# Altium footprint library AI.PcbLib: 137 footprints (part 1 of 9)
Each footprint in its own frame and in the unit in brackets; x right, y up, seen from the top. Pads: shape width x height; smd on the part's side, far side on the other; paste and mask are expansions set on the pad; w line width, h text height; cw(c..) or ccw(c..) is an arc to the next point about the centre after c.
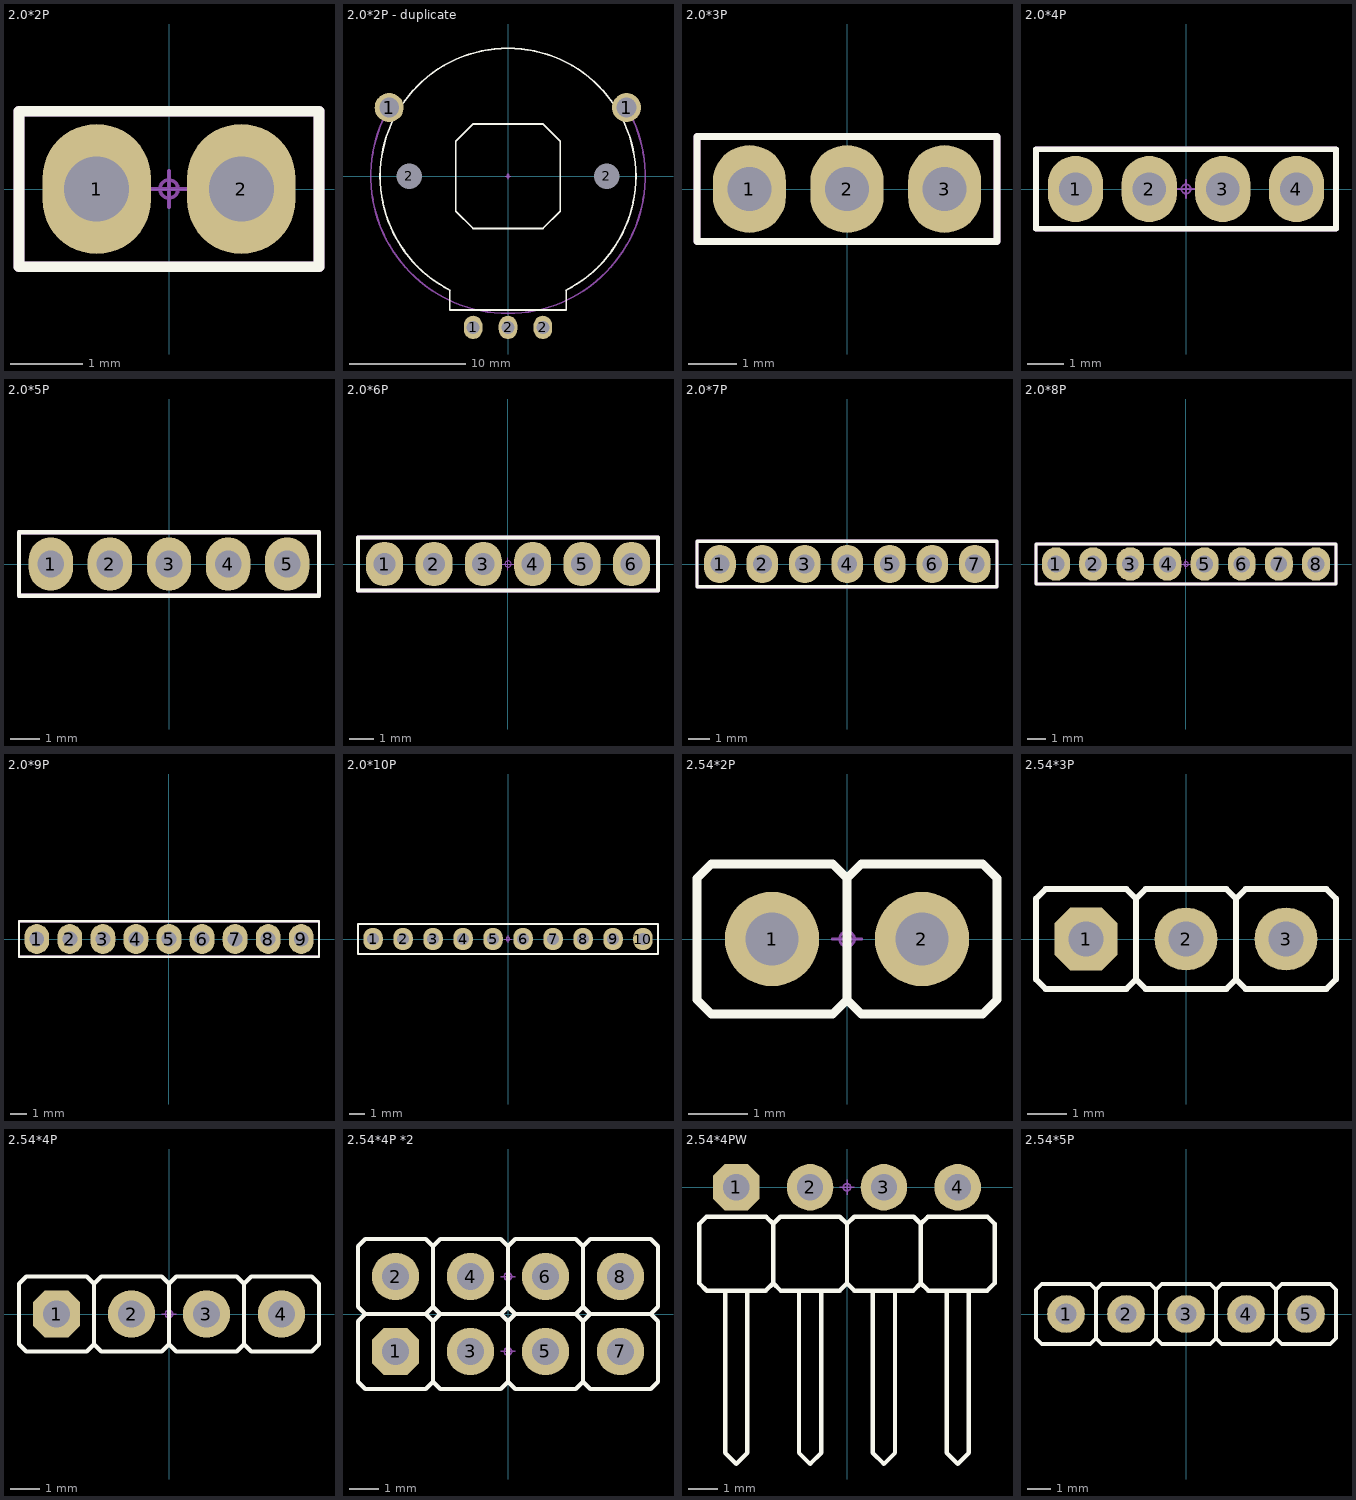
[diagram p0: the footprints below, top view; thin cyan lines are the x and y axes]

## 2.0*2P [mm]
height 8.4
pads (2):
  oval 1.5x1.8 hole 0.9: 1(-1,0) 2(1,0)
Top Overlay:
  lines w0.15: -2.075,-1.075 2.075,-1.075 2.075,1.075 -2.075,1.075 -2.075,-1.075
Mechanical 15:
  circle w0.05: c0,0 r0.125
  lines w0.05: -0.25,0 0.25,0 ; 0,-0.25 0,0.25
  lines w0.15: -2.075,-1.075 2.075,-1.075 2.075,1.075 -2.075,1.075 -2.075,-1.075
3D body "1x2x02.stp": height 5.6, standoff -2.8, extent -2,-1 2,1

## 2.0*2P - duplicate [mm]
height 8.4
pads (7):
  round 2.5 hole 1.7: 1(-10.219,5.9) 1(10.2,5.9)
  oval 1.6x2 hole 1.1: 1(-3,-13) 2(0,-13) 2(3,-13)
  round 1.5 hole 2.2: 2(-8.5,0) 2(8.5,0)
Top Overlay:
  lines w0.152: -5,-9.8 -5,-11.5 5,-11.5 5,-9.798 ; -4.999,-9.798 cw(c0,0) 4.999,-9.798 ; -4.5,-3 -3,-4.5 3,-4.5 4.5,-3 4.5,3 3,4.5 -3,4.5 -4.5,3 -4.5,-3
Mechanical 11:
  lines w0.152: -10.219,5.9 ccw(c0,0) 0,-11.8 ccw(c0,0) 10.219,5.9
Mechanical 15:
  circle w0.05: c0,0 r0.125
  lines w0.05: -0.25,0 0.25,0 ; 0,-0.25 0,0.25

## 2.0*3P [mm]
height 8.4
pads (3):
  oval 1.5x1.8 hole 0.9: 1(-2,0) 2(0,0) 3(2,0)
Top Overlay:
  lines w0.15: -3.075,-1.075 -3.075,1.075 3.075,1.075 3.075,-1.075 -3.075,-1.075
Mechanical 15:
  circle w0.05: c0,0 r0.125
  lines w0.05: -0.25,0 0.25,0 ; 0,-0.25 0,0.25
  lines w0.15: -3.075,-1.075 -3.075,1.075 3.075,1.075 3.075,-1.075 -3.075,-1.075
3D body "1x2x03.stp": height 5.6, standoff -2.8, extent -3,-1 3,1

## 2.0*4P [mm]
height 8.4
pads (4):
  oval 1.5x1.8 hole 0.9: 1(-3,0) 2(-1,0) 3(1,0) 4(3,0)
Top Overlay:
  lines w0.15: -4.075,-1.075 -4.075,1.075 4.075,1.075 4.075,-1.075 -4.075,-1.075
Mechanical 15:
  circle w0.05: c0,0 r0.125
  lines w0.05: -0.25,0 0.25,0 ; 0,-0.25 0,0.25
  lines w0.15: -4.075,-1.075 -4.075,1.075 4.075,1.075 4.075,-1.075 -4.075,-1.075
3D body "1x2x04.stp": height 5.6, standoff -2.8, extent -4,-1 4,1

## 2.0*5P [mm]
height 8.4
pads (5):
  oval 1.5x1.8 hole 0.9: 1(-4,0) 2(-2,0) 3(0,0) 4(2,0) 5(4,0)
Top Overlay:
  lines w0.15: -5.075,-1.075 -5.075,1.075 5.075,1.075 5.075,-1.075 -5.075,-1.075
Mechanical 15:
  circle w0.05: c0,0 r0.125
  lines w0.05: -0.25,0 0.25,0 ; 0,-0.25 0,0.25
  lines w0.15: -5.075,-1.075 -5.075,1.075 5.075,1.075 5.075,-1.075 -5.075,-1.075
3D body "1x2x05.stp": height 5.6, standoff -2.8, extent -5,-1 5,1

## 2.0*6P [mm]
height 8.4
pads (6):
  oval 1.5x1.8 hole 0.9: 1(-5,0) 2(-3,0) 3(-1,0) 4(1,0) 5(3,0) 6(5,0)
Top Overlay:
  lines w0.15: -6.075,-1.075 -6.075,1.075 6.075,1.075 6.075,-1.075 -6.075,-1.075
Mechanical 15:
  circle w0.05: c0,0 r0.125
  lines w0.05: -0.25,0 0.25,0 ; 0,-0.25 0,0.25
  lines w0.15: -6.075,-1.075 -6.075,1.075 6.075,1.075 6.075,-1.075 -6.075,-1.075
3D body "1x2x06.stp": height 5.6, standoff -2.8, extent -6,-1 6,1

## 2.0*7P [mm]
height 8.4
pads (7):
  oval 1.5x1.8 hole 0.9: 1(-6,0) 2(-4,0) 3(-2,0) 4(0,0) 5(2,0) 6(4,0) 7(6,0)
Top Overlay:
  lines w0.15: -7.075,-1.075 -7.075,1.075 7.05,1.075 7.05,-1.075 -7.075,-1.075
Mechanical 15:
  circle w0.05: c0,0 r0.125
  lines w0.05: -0.25,0 0.25,0 ; 0,-0.25 0,0.25
  lines w0.15: -7.075,-1.075 -7.075,1.075 7.05,1.075 7.05,-1.075 -7.075,-1.075
3D body "1x2x07.stp": height 5.6, standoff -2.8, extent -7.025,-1 6.975,1

## 2.0*8P [mm]
height 8.4
pads (8):
  oval 1.5x1.8 hole 0.9: 1(-7,0) 2(-5,0) 3(-3,0) 4(-1,0) 5(1,0) 6(3,0) 7(5,0) 8(7,0)
Top Overlay:
  lines w0.15: -8.075,-1.075 -8.075,1.075 8.075,1.075 8.075,-1.075 -8.075,-1.075
Mechanical 15:
  circle w0.05: c0,0 r0.125
  lines w0.05: -0.25,0 0.25,0 ; 0,-0.25 0,0.25
  lines w0.15: -8.075,-1.075 -8.075,1.075 8.075,1.075 8.075,-1.075 -8.075,-1.075
3D body "1x2x08.stp": height 5.6, standoff -2.8, extent -8,-1 8,1

## 2.0*9P [mm]
height 8.4
pads (9):
  oval 1.5x1.8 hole 0.9: 1(-8,0) 2(-6,0) 3(-4,0) 4(-2,0) 5(0,0) 6(2,0) 7(4,0) 8(6,0) 9(8,0)
Top Overlay:
  lines w0.15: -9.075,-1.075 -9.075,1.075 9.075,1.075 9.075,-1.075 -9.075,-1.075
Mechanical 15:
  circle w0.05: c0,0 r0.125
  lines w0.05: -0.25,0 0.25,0 ; 0,-0.25 0,0.25
  lines w0.15: -9.075,-1.075 -9.075,1.075 9.075,1.075 9.075,-1.075 -9.075,-1.075
3D body "1x2x09.stp": height 5.6, standoff -2.8, extent -9.025,-1 8.975,1

## 2.0*10P [mm]
height 8.4
pads (10):
  oval 1.3x1.5 hole 0.8: 1(-9,0) 2(-7,0) 3(-5,0) 4(-3,0) 5(-1,0) 6(1,0) 7(3,0) 8(5,0) 9(7,0) 10(9,0)
Top Overlay:
  lines w0.15: -10,-1 10,-1 10,1 -10,1 -10,-1
Mechanical 15:
  circle w0.05: c0,0 r0.125
  lines w0.05: -0.25,0 0.25,0 ; 0,-0.25 0,0.25

## 2.54*2P [mm]
pads (2):
  round 1.6 hole 0.9: 1(-1.27,0) 2(1.27,0)
Top Overlay:
  lines w0.152: 0,-1.025 0.245,-1.27 2.295,-1.27 2.54,-1.025 2.54,1.025 2.295,1.27 0.245,1.27 0,1.025 ; 0,-1.025 0,1.025 ; 0,-1.025 -0.245,-1.27 -2.295,-1.27 -2.54,-1.025 -2.54,1.025 -2.295,1.27 -0.245,1.27 0,1.025
Mechanical 15:
  circle w0.05: c0,0 r0.125
  lines w0.05: -0.25,0 0.25,0 ; 0,-0.25 0,0.25
3D body "COMATEL_386.0358.1.02.440.stp": height 8, standoff -3.2, extent -2.54,-1.225 2.54,1.225

## 2.54*3P [mm]
pads (3):
  oct 1.6x1.6 hole 0.9: 1(-2.54,0)
  round 1.6 hole 0.9: 2(0,0) 3(2.54,0)
Top Overlay:
  lines w0.152: -1.27,-1.025 -1.025,-1.27 1.025,-1.27 1.27,-1.025 ; -1.27,-1.025 -1.27,1.025 ; -1.27,-1.025 -1.515,-1.27 -3.565,-1.27 -3.81,-1.025 -3.81,1.025 -3.565,1.27 -1.515,1.27 -1.27,1.025 ; -1.27,1.025 -1.025,1.27 1.025,1.27 1.27,1.025 ; 1.27,-1.025 1.515,-1.27 3.565,-1.27 3.81,-1.025 3.81,1.025 3.565,1.27 1.515,1.27 1.27,1.025 ; 1.27,-1.025 1.27,1.025
Mechanical 15:
  circle w0.05: c0,0 r0.125
  lines w0.05: -0.25,0 0.25,0 ; 0,-0.25 0,0.25
3D body "COMATEL_386.0358.1.03.440.stp": height 8, standoff -3.2, extent -3.81,-1.225 3.81,1.225

## 2.54*4P [mm]
pads (4):
  oct 1.6x1.6 hole 0.9: 1(-3.81,0)
  round 1.6 hole 0.9: 2(-1.27,0) 3(1.27,0) 4(3.81,0)
Top Overlay:
  lines w0.152: -2.54,-1.025 -2.295,-1.27 -0.245,-1.27 0,-1.025 ; -2.54,-1.025 -2.54,1.025 ; -2.54,-1.025 -2.785,-1.27 -4.835,-1.27 -5.08,-1.025 -5.08,1.025 -4.835,1.27 -2.785,1.27 -2.54,1.025 ; -2.54,1.025 -2.295,1.27 -0.245,1.27 0,1.025 ; 0,-1.025 0.245,-1.27 2.295,-1.27 2.54,-1.025 ; 0,-1.025 0,1.025 ; 0,1.025 0.245,1.27 2.295,1.27 2.54,1.025 ; 2.54,-1.025 2.785,-1.27 4.835,-1.27 5.08,-1.025 5.08,1.025 4.835,1.27 2.785,1.27 2.54,1.025 ; 2.54,-1.025 2.54,1.025
Mechanical 15:
  circle w0.05: c0,0 r0.125
  lines w0.05: -0.25,0 0.25,0 ; 0,-0.25 0,0.25
3D body "COMATEL_385.0358.1.04.400.stp": height 8, standoff -3.2, extent -5.08,-1.225 5.08,1.225

## 2.54*4P *2 [mm]
pads (8):
  oct 1.6x1.6 hole 0.9: 1(-3.81,-1.27)
  round 1.6 hole 0.9: 2(-3.81,1.27) 3(-1.27,-1.27) 4(-1.27,1.27) 5(1.27,-1.27) 6(1.27,1.27) 7(3.81,-1.27) 8(3.81,1.27)
Top Overlay:
  lines w0.152: -4.835,0 -5.08,-0.245 -5.08,-2.295 -4.835,-2.54 -2.785,-2.54 -2.54,-2.295 ; -4.835,0 -5.08,0.245 -5.08,2.295 -4.835,2.54 -2.785,2.54 -2.54,2.295 ; -4.835,0 -2.785,0 ; -2.785,0 -2.54,-0.245 ; -2.785,0 -2.54,0.245 ; -2.54,-2.295 -2.54,-0.245 ; -2.54,-2.295 -2.295,-2.54 -0.245,-2.54 0,-2.295 ; -2.54,-0.245 -2.295,0 ; -2.54,0.245 -2.295,0 ; -2.54,0.245 -2.54,2.295 ; -2.54,2.295 -2.295,2.54 -0.245,2.54 0,2.295 ; -2.295,0 -0.245,0 ; -0.245,0 0,-0.245 ; -0.245,0 0,0.245 ; 0,-2.295 0,-0.245 ; 0,-2.295 0.245,-2.54 2.295,-2.54 2.54,-2.295 ; 0,-0.245 0.245,0 ; 0,0.245 0.245,0 ; 0,0.245 0,2.295 ; 0,2.295 0.245,2.54 2.295,2.54 2.54,2.295 ; 0.245,0 2.295,0 ; 2.295,0 2.54,-0.245 ; 2.295,0 2.54,0.245 ; 2.54,-2.295 2.54,-0.245 ; 2.54,-2.295 2.785,-2.54 4.835,-2.54 5.08,-2.295 5.08,-0.245 4.835,0 ; 2.54,-0.245 2.785,0 ; 2.54,0.245 2.785,0 ; 2.54,0.245 2.54,2.295 ; 2.54,2.295 2.785,2.54 4.835,2.54 5.08,2.295 5.08,0.245 4.835,0 ; 2.785,0 4.835,0
Mechanical 15:
  circle w0.05: c0,-1.27 r0.125
  circle w0.05: c0,1.27 r0.125
  lines w0.05: -0.25,-1.27 0.25,-1.27 ; -0.25,1.27 0.25,1.27 ; 0,-1.52 0,-1.02 ; 0,1.02 0,1.52
3D body "COMATEL_385.0358.1.04.400.stp": height 8, standoff -3.2, extent -5.08,-2.495 5.08,-0.045
3D body "COMATEL_385.0358.1.04.400.stp": height 8, standoff -3.2, extent -5.08,0.045 5.08,2.495

## 2.54*4PW [mm]
pads (4):
  oct 1.6x1.6 hole 0.9: 1(-3.81,0)
  round 1.6 hole 0.9: 2(-1.27,0) 3(1.27,0) 4(3.81,0)
Top Overlay:
  lines w0.152: -4.831,-3.561 -5.08,-3.311 -5.08,-1.261 -4.835,-1.016 -2.785,-1.016 -2.54,-1.261 -2.295,-1.016 -0.245,-1.016 0,-1.261 0.245,-1.016 2.295,-1.016 2.54,-1.261 2.785,-1.016 4.835,-1.016 5.08,-1.261 ; -4.826,-3.556 -2.794,-3.556 -2.54,-3.302 ; -4.191,-3.556 -4.191,-9.144 -3.81,-9.525 -3.429,-9.144 -3.429,-3.556 ; -2.54,-1.252 -2.54,-3.302 ; -1.651,-3.556 -1.651,-9.144 -1.27,-9.525 -0.889,-9.144 -0.889,-3.556 ; 0,-1.252 0,-3.302 ; 0.889,-3.556 0.889,-9.144 1.27,-9.525 1.651,-9.144 1.651,-3.556 ; 2.54,-1.252 2.54,-3.302 ; 3.429,-3.556 3.429,-9.144 3.81,-9.525 4.191,-9.144 4.191,-3.556 ; 5.08,-1.252 5.08,-3.302 4.826,-3.556 2.794,-3.556 2.54,-3.302 ; -2.54,-3.302 -2.286,-3.556 -0.254,-3.556 0,-3.302 ; 0,-3.302 0.254,-3.556 2.286,-3.556 2.54,-3.302
Mechanical 15:
  circle w0.05: c0,0 r0.125
  lines w0.05: -0.25,0 0.25,0 ; 0,-0.25 0,0.25
3D body "hdr4.stp": height 2.54, standoff -1, extent -5.08,-10.001 5.08,0.349

## 2.54*5P [mm]
pads (5):
  round 1.6 hole 0.9: 1(-5.08,0) 2(-2.54,0) 3(0,0) 4(2.54,0) 5(5.08,0)
Top Overlay:
  lines w0.152: -3.81,-1.025 -4.055,-1.27 -6.105,-1.27 -6.35,-1.025 -6.35,1.025 -6.105,1.27 -4.055,1.27 -3.81,1.025 ; -3.81,-1.025 -3.81,1.025 ; -3.81,-1.025 -3.565,-1.27 -1.515,-1.27 -1.27,-1.025 ; -3.81,1.025 -3.565,1.27 -1.515,1.27 -1.27,1.025 ; -1.27,-1.025 -1.27,1.025 ; -1.27,-1.025 -1.025,-1.27 1.025,-1.27 1.27,-1.025 ; -1.27,1.025 -1.025,1.27 1.025,1.27 1.27,1.025 ; 1.27,-1.025 1.27,1.025 ; 1.27,-1.025 1.515,-1.27 3.565,-1.27 3.81,-1.025 ; 1.27,1.025 1.515,1.27 3.565,1.27 3.81,1.025 ; 3.81,-1.025 4.055,-1.27 6.105,-1.27 6.35,-1.025 6.35,1.025 6.105,1.27 4.055,1.27 3.81,1.025 ; 3.81,-1.025 3.81,1.025
Mechanical 15:
  circle w0.05: c0,0 r0.125
  lines w0.05: -0.25,0 0.25,0 ; 0,-0.25 0,0.25
3D body "COMATEL_386.0358.1.05.440.stp": height 8, standoff -3.2, extent -6.35,-1.225 6.35,1.225